# Altium footprint library 逸芬的库鸭.PcbLib: 255 footprints (part 11 of 20)
Each footprint in its own frame and in the unit in brackets; x right, y up, seen from the top. Pads: shape width x height; smd on the part's side, far side on the other; paste and mask are expansions set on the pad; w line width, h text height; cw(c..) or ccw(c..) is an arc to the next point about the centre after c.
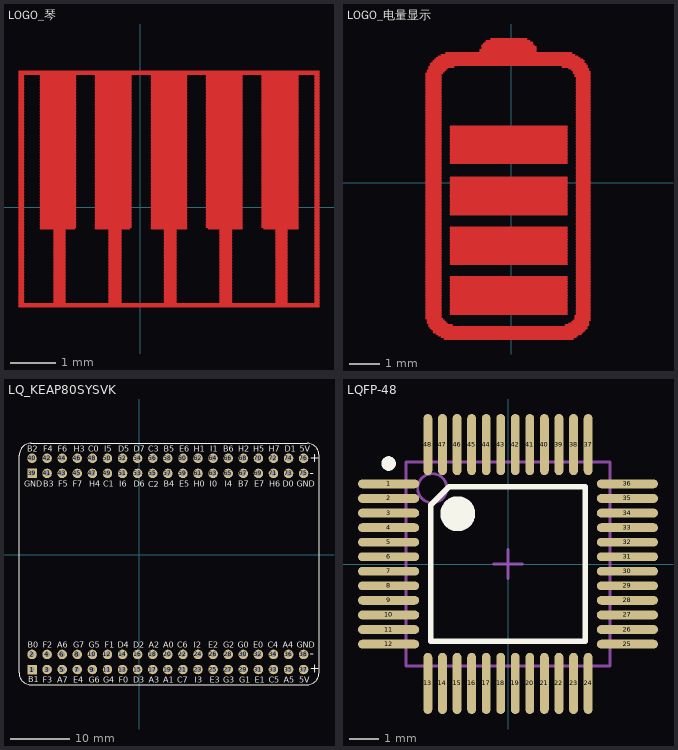
[diagram p10: the footprints below, top view; thin cyan lines are the x and y axes]

## LOGO_琴 [mm]
Top Layer:
  lines w0.033: -2.667,-2.187 3.937,-2.187 ; -2.667,-2.154 3.937,-2.154 ; -2.667,-2.121 3.937,-2.121 ; -2.667,-2.088 -2.568,-2.088 ; -2.667,-2.055 -2.568,-2.055 ; -2.667,-2.022 -2.568,-2.022 ; -2.667,-1.989 -2.568,-1.989 ; -2.667,-1.956 -2.568,-1.956 ; -2.667,-1.923 -2.568,-1.923 ; -2.667,-1.89 -2.568,-1.89 ; -2.667,-1.857 -2.568,-1.857 ; -2.667,-1.824 -2.568,-1.824 ; -2.667,-1.791 -2.568,-1.791 ; -2.667,-1.758 -2.568,-1.758 ; -2.667,-1.725 -2.568,-1.725 ; -2.667,-1.692 -2.568,-1.692 ; -2.667,-1.659 -2.568,-1.659 ; -2.667,-1.626 -2.568,-1.626 ; -2.667,-1.593 -2.568,-1.593 ; -2.667,-1.56 -2.568,-1.56 ; -2.667,-1.527 -2.568,-1.527 ; -2.667,-1.494 -2.568,-1.494 ; -2.667,-1.46 -2.568,-1.46 ; -2.667,-1.427 -2.568,-1.427 ; -2.667,-1.394 -2.568,-1.394 ; -2.667,-1.361 -2.568,-1.361 ; -2.667,-1.328 -2.568,-1.328 ; -2.667,-1.295 -2.568,-1.295 ; -2.667,-1.262 -2.568,-1.262 ; -2.667,-1.229 -2.568,-1.229 ; -2.667,-1.196 -2.568,-1.196 ; -2.667,-1.163 -2.568,-1.163 ; -2.667,-1.13 -2.568,-1.13 ; -2.667,-1.097 -2.568,-1.097 ; -2.667,-1.064 -2.568,-1.064 ; -2.667,-1.031 -2.568,-1.031 ; -2.667,-0.998 -2.568,-0.998 ; -2.667,-0.965 -2.568,-0.965 ; -2.667,-0.932 -2.568,-0.932 ; -2.667,-0.899 -2.568,-0.899 ; -2.667,-0.866 -2.568,-0.866 ; -2.667,-0.833 -2.568,-0.833 ; -2.667,-0.8 -2.568,-0.8 ; -2.667,-0.767 -2.568,-0.767 ; -2.667,-0.734 -2.568,-0.734 ; -2.667,-0.701 -2.568,-0.701 ; -2.667,-0.668 -2.568,-0.668 ; -2.667,-0.635 -2.568,-0.635 ; -2.667,-0.602 -2.568,-0.602 ; -2.667,-0.569 -2.568,-0.569 ; -2.667,-0.536 -2.568,-0.536 ; -2.667,-0.503 -2.568,-0.503 ; -2.667,-0.47 -2.568,-0.47 ; -2.667,-0.437 -2.568,-0.437 ; -2.667,-0.404 -2.568,-0.404 ; -2.667,-0.371 -2.568,-0.371 ; -2.667,-0.338 -2.568,-0.338 ; -2.667,-0.305 -2.568,-0.305 ; -2.667,-0.272 -2.568,-0.272 ; -2.667,-0.239 -2.568,-0.239 ; -2.667,-0.206 -2.568,-0.206 ; -2.667,-0.173 -2.568,-0.173 ; -2.667,-0.14 -2.568,-0.14 ; -2.667,-0.107 -2.568,-0.107 ; -2.667,-0.074 -2.568,-0.074 ; -2.667,-0.041 -2.568,-0.041 ; -2.667,-0.008 -2.568,-0.008 ; -2.667,0.025 -2.568,0.025 ; -2.667,0.058 -2.568,0.058 ; -2.667,0.091 -2.568,0.091 ; -2.667,0.124 -2.568,0.124 ; -2.667,0.157 -2.568,0.157 ; -2.667,0.191 -2.568,0.191 ; -2.667,0.224 -2.568,0.224 ; -2.667,0.257 -2.568,0.257 ; -2.667,0.29 -2.568,0.29 ; -2.667,0.323 -2.568,0.323 ; -2.667,0.356 -2.568,0.356 ; -2.667,0.389 -2.568,0.389 ; -2.667,0.422 -2.568,0.422 ; -2.667,0.455 -2.568,0.455 ; -2.667,0.488 -2.568,0.488 ; -2.667,0.521 -2.568,0.521 ; -2.667,0.554 -2.568,0.554 ; -2.667,0.587 -2.568,0.587 ; -2.667,0.62 -2.568,0.62 ; -2.667,0.653 -2.568,0.653 ; -2.667,0.686 -2.568,0.686 ; -2.667,0.719 -2.568,0.719 ; -2.667,0.752 -2.568,0.752 ; -2.667,0.785 -2.568,0.785 ; -2.667,0.818 -2.568,0.818 ; -2.667,0.851 -2.568,0.851 ; -2.667,0.884 -2.568,0.884 ; -2.667,0.917 -2.568,0.917 ; -2.667,0.95 -2.568,0.95 ; -2.667,0.983 -2.568,0.983 ; -2.667,1.016 -2.568,1.016 ; -2.667,1.049 -2.568,1.049 ; -2.667,1.082 -2.568,1.082 ; -2.667,1.115 -2.568,1.115 ; -2.667,1.148 -2.568,1.148 ; -2.667,1.181 -2.568,1.181 ; -2.667,1.214 -2.568,1.214 ; -2.667,1.247 -2.568,1.247 ; -2.667,1.28 -2.568,1.28 ; -2.667,1.313 -2.568,1.313 ; -2.667,1.346 -2.568,1.346 ; -2.667,1.379 -2.568,1.379 ; -2.667,1.412 -2.568,1.412 ; -2.667,1.445 -2.568,1.445 ; -2.667,1.478 -2.568,1.478 ; -2.667,1.511 -2.568,1.511 ; -2.667,1.544 -2.568,1.544 ; -2.667,1.577 -2.568,1.577 ; -2.667,1.61 -2.568,1.61 ; -2.667,1.643 -2.568,1.643 ; -2.667,1.676 -2.568,1.676 ; -2.667,1.709 -2.568,1.709 ; -2.667,1.742 -2.568,1.742 ; -2.667,1.775 -2.568,1.775 ; -2.667,1.808 -2.568,1.808 ; -2.667,1.841 -2.568,1.841 ; -2.667,1.875 -2.568,1.875 ; -2.667,1.908 -2.568,1.908 ; -2.667,1.941 -2.568,1.941 ; -2.667,1.974 -2.568,1.974 ; -2.667,2.007 -2.568,2.007 ; -2.667,2.04 -2.568,2.04 ; -2.667,2.073 -2.568,2.073 ; -2.667,2.106 -2.568,2.106 ; -2.667,2.139 -2.568,2.139 ; -2.667,2.172 -2.568,2.172 ; -2.667,2.205 -2.568,2.205 ; -2.667,2.238 -2.568,2.238 ; -2.667,2.271 -2.568,2.271 ; -2.667,2.304 -2.568,2.304 ; -2.667,2.337 -2.568,2.337 ; -2.667,2.37 -2.568,2.37 ; -2.667,2.403 -2.568,2.403 ; -2.667,2.436 -2.568,2.436 ; -2.667,2.469 -2.568,2.469 ; -2.667,2.502 -2.568,2.502 ; -2.667,2.535 -2.568,2.535 ; -2.667,2.568 -2.568,2.568 ; -2.667,2.601 -2.568,2.601 ; -2.667,2.634 -2.568,2.634 ; -2.667,2.667 -2.568,2.667 ; -2.667,2.7 -2.568,2.7 ; -2.667,2.733 -2.568,2.733 ; -2.667,2.766 -2.568,2.766 ; -2.667,2.799 -2.568,2.799 ; -2.667,2.832 -2.568,2.832 ; -2.667,2.865 -2.568,2.865 ; -2.667,2.898 -2.568,2.898 ; -2.667,2.931 3.937,2.931 ; -2.667,2.964 3.937,2.964 ; -2.667,2.997 3.937,2.997 ; -2.205,-0.47 -1.445,-0.47 ; -2.205,-0.437 -1.412,-0.437 ; -2.205,-0.404 -1.412,-0.404 ; -2.205,-0.371 -1.412,-0.371 ; -2.205,-0.338 -1.412,-0.338 ; -2.205,-0.305 -1.412,-0.305 ; -2.205,-0.272 -1.412,-0.272 ; -2.205,-0.239 -1.412,-0.239 ; -2.205,-0.206 -1.412,-0.206 ; -2.205,-0.173 -1.412,-0.173 ; -2.205,-0.14 -1.412,-0.14 ; -2.205,-0.107 -1.412,-0.107 ; -2.205,-0.074 -1.412,-0.074 ; -2.205,-0.041 -1.412,-0.041 ; -2.205,-0.008 -1.412,-0.008 ; -2.205,0.025 -1.412,0.025 ; -2.205,0.058 -1.412,0.058 ; -2.205,0.091 -1.412,0.091 ; -2.205,0.124 -1.412,0.124 ; -2.205,0.157 -1.412,0.157 ; -2.205,0.191 -1.412,0.191 ; -2.205,0.224 -1.412,0.224 ; -2.205,0.257 -1.412,0.257 ; -2.205,0.29 -1.412,0.29 ; -2.205,0.323 -1.412,0.323 ; -2.205,0.356 -1.412,0.356 ; -2.205,0.389 -1.412,0.389 ; -2.205,0.422 -1.412,0.422 ; -2.205,0.455 -1.412,0.455 ; -2.205,0.488 -1.412,0.488 ; -2.205,0.521 -1.412,0.521 ; -2.205,0.554 -1.412,0.554 ; -2.205,0.587 -1.412,0.587 ; -2.205,0.62 -1.412,0.62 ; -2.205,0.653 -1.412,0.653 ; -2.205,0.686 -1.412,0.686 ; -2.205,0.719 -1.412,0.719 ; -2.205,0.752 -1.412,0.752 ; -2.205,0.785 -1.412,0.785 ; -2.205,0.818 -1.412,0.818 ; -2.205,0.851 -1.412,0.851 ; -2.205,0.884 -1.412,0.884 ; -2.205,0.917 -1.412,0.917 ; -2.205,0.95 -1.412,0.95 ; -2.205,0.983 -1.412,0.983 ; -2.205,1.016 -1.412,1.016 ; -2.205,1.049 -1.412,1.049 ; -2.205,1.082 -1.412,1.082 ; -2.205,1.115 -1.412,1.115 ; -2.205,1.148 -1.412,1.148 ; -2.205,1.181 -1.412,1.181 ; -2.205,1.214 -1.412,1.214 ; -2.205,1.247 -1.412,1.247 ; -2.205,1.28 -1.412,1.28 ; -2.205,1.313 -1.412,1.313 ; -2.205,1.346 -1.412,1.346 ; -2.205,1.379 -1.412,1.379 ; -2.205,1.412 -1.412,1.412 ; -2.205,1.445 -1.412,1.445 ; -2.205,1.478 -1.412,1.478 ; -2.205,1.511 -1.412,1.511 ; -2.205,1.544 -1.412,1.544 ; -2.205,1.577 -1.412,1.577 ; -2.205,1.61 -1.412,1.61 ; -2.205,1.643 -1.412,1.643 ; -2.205,1.676 -1.412,1.676 ; -2.205,1.709 -1.412,1.709 ; -2.205,1.742 -1.412,1.742 ; -2.205,1.775 -1.412,1.775 ; -2.205,1.808 -1.412,1.808 ; -2.205,1.841 -1.412,1.841 ; -2.205,1.875 -1.412,1.875 ; -2.205,1.908 -1.412,1.908 ; -2.205,1.941 -1.412,1.941 ; -2.205,1.974 -1.412,1.974 ; -2.205,2.007 -1.412,2.007 ; -2.205,2.04 -1.412,2.04 ; -2.205,2.073 -1.412,2.073 ; -2.205,2.106 -1.412,2.106 ; -2.205,2.139 -1.412,2.139 ; -2.205,2.172 -1.412,2.172 ; -2.205,2.205 -1.412,2.205 ; -2.205,2.238 -1.412,2.238 ; -2.205,2.271 -1.412,2.271 ; -2.205,2.304 -1.412,2.304 ; -2.205,2.337 -1.412,2.337 ; -2.205,2.37 -1.412,2.37 ; -2.205,2.403 -1.412,2.403 ; -2.205,2.436 -1.412,2.436 ; -2.205,2.469 -1.412,2.469 ; -2.205,2.502 -1.412,2.502 ; -2.205,2.535 -1.412,2.535 ; -2.205,2.568 -1.412,2.568 ; -2.205,2.601 -1.412,2.601 ; -2.205,2.634 -1.412,2.634 ; -2.205,2.667 -1.412,2.667 ; -2.205,2.7 -1.412,2.7 ; -2.205,2.733 -1.412,2.733 ; -2.205,2.766 -1.412,2.766 ; -2.205,2.799 -1.412,2.799 ; -2.205,2.832 -1.412,2.832 ; -2.205,2.865 -1.412,2.865 ; -2.205,2.898 -1.412,2.898 ; -1.908,-2.088 -1.643,-2.088 ; -1.908,-2.055 -1.643,-2.055 ; -1.908,-2.022 -1.643,-2.022 ; -1.908,-1.989 -1.643,-1.989 ; -1.908,-1.956 -1.643,-1.956 ; -1.908,-1.923 -1.643,-1.923 ; -1.908,-1.89 -1.643,-1.89 ; -1.908,-1.857 -1.643,-1.857 ; -1.908,-1.824 -1.643,-1.824 ; -1.908,-1.791 -1.643,-1.791 ; -1.908,-1.758 -1.643,-1.758 ; -1.908,-1.725 -1.643,-1.725 ; -1.908,-1.692 -1.643,-1.692 ; -1.908,-1.659 -1.643,-1.659 ; -1.908,-1.626 -1.643,-1.626 ; -1.908,-1.593 -1.643,-1.593 ; -1.908,-1.56 -1.643,-1.56 ; -1.908,-1.527 -1.643,-1.527 ; -1.908,-1.494 -1.643,-1.494 ; -1.908,-1.46 -1.643,-1.46 ; -1.908,-1.427 -1.643,-1.427 ; -1.908,-1.394 -1.643,-1.394 ; -1.908,-1.361 -1.643,-1.361 ; -1.908,-1.328 -1.643,-1.328 ; -1.908,-1.295 -1.643,-1.295 ; -1.908,-1.262 -1.643,-1.262 ; -1.908,-1.229 -1.643,-1.229 ; -1.908,-1.196 -1.643,-1.196 ; -1.908,-1.163 -1.643,-1.163 ; -1.908,-1.13 -1.643,-1.13 ; -1.908,-1.097 -1.643,-1.097 ; -1.908,-1.064 -1.643,-1.064 ; -1.908,-1.031 -1.643,-1.031 ; -1.908,-0.998 -1.643,-0.998 ; -1.908,-0.965 -1.643,-0.965 ; -1.908,-0.932 -1.643,-0.932 ; -1.908,-0.899 -1.643,-0.899 ; -1.908,-0.866 -1.643,-0.866 ; -1.908,-0.833 -1.643,-0.833 ; -1.908,-0.8 -1.643,-0.8 ; -1.908,-0.767 -1.643,-0.767 ; -1.908,-0.734 -1.643,-0.734 ; -1.908,-0.701 -1.643,-0.701 ; -1.908,-0.668 -1.643,-0.668 ; -1.908,-0.635 -1.643,-0.635 ; -1.908,-0.602 -1.643,-0.602 ; -1.908,-0.569 -1.643,-0.569 ; -1.908,-0.536 -1.643,-0.536 ; -1.908,-0.503 -1.643,-0.503 ; -0.983,-0.47 -0.224,-0.47 ; -0.983,-0.437 -0.191,-0.437 ; -0.983,-0.404 -0.191,-0.404 ; -0.983,-0.371 -0.191,-0.371 ; -0.983,-0.338 -0.191,-0.338 ; -0.983,-0.305 -0.191,-0.305 ; -0.983,-0.272 -0.191,-0.272 ; -0.983,-0.239 -0.191,-0.239 ; -0.983,-0.206 -0.191,-0.206 ; -0.983,-0.173 -0.191,-0.173 ; -0.983,-0.14 -0.191,-0.14 ; -0.983,-0.107 -0.191,-0.107 ; -0.983,-0.074 -0.191,-0.074 ; -0.983,-0.041 -0.191,-0.041 ; -0.983,-0.008 -0.191,-0.008 ; -0.983,0.025 -0.191,0.025 ; -0.983,0.058 -0.191,0.058 ; -0.983,0.091 -0.191,0.091 ; -0.983,0.124 -0.191,0.124 ; -0.983,0.157 -0.191,0.157 ; -0.983,0.191 -0.191,0.191 ; -0.983,0.224 -0.191,0.224 ; -0.983,0.257 -0.191,0.257 ; -0.983,0.29 -0.191,0.29 ; -0.983,0.323 -0.191,0.323 ; -0.983,0.356 -0.191,0.356 ; -0.983,0.389 -0.191,0.389 ; -0.983,0.422 -0.191,0.422 ; -0.983,0.455 -0.191,0.455 ; -0.983,0.488 -0.191,0.488 ; -0.983,0.521 -0.191,0.521 ; -0.983,0.554 -0.191,0.554 ; -0.983,0.587 -0.191,0.587 ; -0.983,0.62 -0.191,0.62 ; -0.983,0.653 -0.191,0.653 ; -0.983,0.686 -0.191,0.686 ; -0.983,0.719 -0.191,0.719 ; -0.983,0.752 -0.191,0.752 ; -0.983,0.785 -0.191,0.785 ; -0.983,0.818 -0.191,0.818 ; -0.983,0.851 -0.191,0.851 ; -0.983,0.884 -0.191,0.884 ; -0.983,0.917 -0.191,0.917 ; -0.983,0.95 -0.191,0.95 ; -0.983,0.983 -0.191,0.983 ; -0.983,1.016 -0.191,1.016 ; -0.983,1.049 -0.191,1.049 ; -0.983,1.082 -0.191,1.082 ; -0.983,1.115 -0.191,1.115 ; -0.983,1.148 -0.191,1.148 ; -0.983,1.181 -0.191,1.181 ; -0.983,1.214 -0.191,1.214 ; -0.983,1.247 -0.191,1.247 ; -0.983,1.28 -0.191,1.28 ; -0.983,1.313 -0.191,1.313 ; -0.983,1.346 -0.191,1.346 ; -0.983,1.379 -0.191,1.379 ; -0.983,1.412 -0.191,1.412 ; -0.983,1.445 -0.191,1.445 ; -0.983,1.478 -0.191,1.478 ; -0.983,1.511 -0.191,1.511 ; -0.983,1.544 -0.191,1.544 ; -0.983,1.577 -0.191,1.577 ; -0.983,1.61 -0.191,1.61 ; -0.983,1.643 -0.191,1.643 ; -0.983,1.676 -0.191,1.676 ; -0.983,1.709 -0.191,1.709 ; -0.983,1.742 -0.191,1.742 ; -0.983,1.775 -0.191,1.775 ; -0.983,1.808 -0.191,1.808 ; -0.983,1.841 -0.191,1.841 ; -0.983,1.875 -0.191,1.875 ; -0.983,1.908 -0.191,1.908 ; -0.983,1.941 -0.191,1.941 ; -0.983,1.974 -0.191,1.974 ; -0.983,2.007 -0.191,2.007 ; -0.983,2.04 -0.191,2.04 ; -0.983,2.073 -0.191,2.073 ; -0.983,2.106 -0.191,2.106 ; -0.983,2.139 -0.191,2.139 ; -0.983,2.172 -0.191,2.172 ; -0.983,2.205 -0.191,2.205 ; -0.983,2.238 -0.191,2.238 ; -0.983,2.271 -0.191,2.271 ; -0.983,2.304 -0.191,2.304 ; -0.983,2.337 -0.191,2.337 ; -0.983,2.37 -0.191,2.37 ; -0.983,2.403 -0.191,2.403 ; -0.983,2.436 -0.191,2.436 ; -0.983,2.469 -0.191,2.469 ; -0.983,2.502 -0.191,2.502 ; -0.983,2.535 -0.191,2.535 ; -0.983,2.568 -0.191,2.568 ; -0.983,2.601 -0.191,2.601 ; -0.983,2.634 -0.191,2.634 ; -0.983,2.667 -0.191,2.667 ; -0.983,2.7 -0.191,2.7 ; -0.983,2.733 -0.191,2.733 ; -0.983,2.766 -0.191,2.766 ; -0.983,2.799 -0.191,2.799 ; -0.983,2.832 -0.191,2.832 ; -0.983,2.865 -0.191,2.865 ; -0.983,2.898 -0.191,2.898 ; -0.686,-2.088 -0.422,-2.088 ; -0.686,-2.055 -0.422,-2.055 ; -0.686,-2.022 -0.422,-2.022 ; -0.686,-1.989 -0.422,-1.989 ; -0.686,-1.956 -0.422,-1.956 ; -0.686,-1.923 -0.422,-1.923 ; -0.686,-1.89 -0.422,-1.89 ; -0.686,-1.857 -0.422,-1.857 ; -0.686,-1.824 -0.422,-1.824 ; -0.686,-1.791 -0.422,-1.791 ; -0.686,-1.758 -0.422,-1.758 ; -0.686,-1.725 -0.422,-1.725 ; -0.686,-1.692 -0.422,-1.692 ; -0.686,-1.659 -0.422,-1.659 ; -0.686,-1.626 -0.422,-1.626 ; -0.686,-1.593 -0.422,-1.593 ; -0.686,-1.56 -0.422,-1.56 ; -0.686,-1.527 -0.422,-1.527 ; -0.686,-1.494 -0.422,-1.494 ; -0.686,-1.46 -0.422,-1.46 ; -0.686,-1.427 -0.422,-1.427 ; -0.686,-1.394 -0.422,-1.394 ; -0.686,-1.361 -0.422,-1.361 ; -0.686,-1.328 -0.422,-1.328 ; -0.686,-1.295 -0.422,-1.295 ; -0.686,-1.262 -0.422,-1.262 ; -0.686,-1.229 -0.422,-1.229 ; -0.686,-1.196 -0.422,-1.196 ; -0.686,-1.163 -0.422,-1.163 ; -0.686,-1.13 -0.422,-1.13 ; -0.686,-1.097 -0.422,-1.097 ; -0.686,-1.064 -0.422,-1.064 ; -0.686,-1.031 -0.422,-1.031 ; -0.686,-0.998 -0.422,-0.998 ; -0.686,-0.965 -0.422,-0.965 ; -0.686,-0.932 -0.422,-0.932 ; -0.686,-0.899 -0.422,-0.899 ; -0.686,-0.866 -0.422,-0.866 ; -0.686,-0.833 -0.422,-0.833 ; -0.686,-0.8 -0.422,-0.8 ; -0.686,-0.767 -0.422,-0.767 ; -0.686,-0.734 -0.422,-0.734 ; -0.686,-0.701 -0.422,-0.701 ; -0.686,-0.668 -0.422,-0.668 ; -0.686,-0.635 -0.422,-0.635 ; -0.686,-0.602 -0.422,-0.602 ; -0.686,-0.569 -0.422,-0.569 ; -0.686,-0.536 -0.422,-0.536 ; -0.686,-0.503 -0.422,-0.503 ; 0.239,-0.47 1.031,-0.47 ; 0.239,-0.437 1.031,-0.437 ; 0.239,-0.404 1.031,-0.404 ; 0.239,-0.371 1.031,-0.371 ; 0.239,-0.338 1.031,-0.338 ; 0.239,-0.305 1.031,-0.305 ; 0.239,-0.272 1.031,-0.272 ; 0.239,-0.239 1.031,-0.239 ; 0.239,-0.206 1.031,-0.206 ; 0.239,-0.173 1.031,-0.173 ; 0.239,-0.14 1.031,-0.14 ; 0.239,-0.107 1.031,-0.107 ; 0.239,-0.074 1.031,-0.074 ; 0.239,-0.041 1.031,-0.041 ; 0.239,-0.008 1.031,-0.008 ; 0.239,0.025 1.031,0.025 ; 0.239,0.058 1.031,0.058 ; 0.239,0.091 1.031,0.091 ; 0.239,0.124 1.031,0.124 ; 0.239,0.157 1.031,0.157 ; 0.239,0.191 1.031,0.191 ; 0.239,0.224 1.031,0.224 ; 0.239,0.257 1.031,0.257 ; 0.239,0.29 1.031,0.29 ; 0.239,0.323 1.031,0.323 ; 0.239,0.356 1.031,0.356 ; 0.239,0.389 1.031,0.389 ; 0.239,0.422 1.031,0.422 ; 0.239,0.455 1.031,0.455 ; 0.239,0.488 1.031,0.488 ; 0.239,0.521 1.031,0.521 ; 0.239,0.554 1.031,0.554 ; 0.239,0.587 1.031,0.587 ; 0.239,0.62 1.031,0.62 ; 0.239,0.653 1.031,0.653 ; 0.239,0.686 1.031,0.686 ; 0.239,0.719 1.031,0.719 ; 0.239,0.752 1.031,0.752 ; 0.239,0.785 1.031,0.785 ; 0.239,0.818 1.031,0.818 ; 0.239,0.851 1.031,0.851 ; 0.239,0.884 1.031,0.884 ; 0.239,0.917 1.031,0.917 ; 0.239,0.95 1.031,0.95 ; 0.239,0.983 1.031,0.983 ; 0.239,1.016 1.031,1.016 ; 0.239,1.049 1.031,1.049 ; 0.239,1.082 1.031,1.082 ; 0.239,1.115 1.031,1.115 ; 0.239,1.148 1.031,1.148 ; 0.239,1.181 1.031,1.181 ; 0.239,1.214 1.031,1.214 ; 0.239,1.247 1.031,1.247 ; 0.239,1.28 1.031,1.28 ; 0.239,1.313 1.031,1.313 ; 0.239,1.346 1.031,1.346 ; 0.239,1.379 1.031,1.379 ; 0.239,1.412 1.031,1.412 ; 0.239,1.445 1.031,1.445 ; 0.239,1.478 1.031,1.478 ; 0.239,1.511 1.031,1.511 ; 0.239,1.544 1.031,1.544 ; 0.239,1.577 1.031,1.577 ; 0.239,1.61 1.031,1.61 ; 0.239,1.643 1.031,1.643 ; 0.239,1.676 1.031,1.676 ; 0.239,1.709 1.031,1.709 ; 0.239,1.742 1.031,1.742 ; 0.239,1.775 1.031,1.775 ; 0.239,1.808 1.031,1.808 ; 0.239,1.841 1.031,1.841 ; 0.239,1.875 1.031,1.875 ; 0.239,1.908 1.031,1.908 ; 0.239,1.941 1.031,1.941 ; 0.239,1.974 1.031,1.974 ; 0.239,2.007 1.031,2.007 ; 0.239,2.04 1.031,2.04 ; 0.239,2.073 1.031,2.073 ; 0.239,2.106 1.031,2.106 ; 0.239,2.139 1.031,2.139 ; 0.239,2.172 1.031,2.172 ; 0.239,2.205 1.031,2.205 ; 0.239,2.238 1.031,2.238 ; 0.239,2.271 1.031,2.271 ; 0.239,2.304 1.031,2.304 ; 0.239,2.337 1.031,2.337 ; 0.239,2.37 1.031,2.37 ; 0.239,2.403 1.031,2.403 ; 0.239,2.436 1.031,2.436 ; 0.239,2.469 1.031,2.469 ; 0.239,2.502 1.031,2.502 ; 0.239,2.535 1.031,2.535 ; 0.239,2.568 1.031,2.568 ; 0.239,2.601 1.031,2.601 ; 0.239,2.634 1.031,2.634 ; 0.239,2.667 1.031,2.667 ; 0.239,2.7 1.031,2.7 ; 0.239,2.733 1.031,2.733 ; 0.239,2.766 1.031,2.766 ; 0.239,2.799 1.031,2.799 ; 0.239,2.832 1.031,2.832 ; 0.239,2.865 1.031,2.865 ; 0.239,2.898 1.031,2.898 ; 0.536,-2.088 0.8,-2.088 ; 0.536,-2.055 0.8,-2.055 ; 0.536,-2.022 0.8,-2.022 ; 0.536,-1.989 0.8,-1.989 ; 0.536,-1.956 0.8,-1.956 ; 0.536,-1.923 0.8,-1.923 ; 0.536,-1.89 0.8,-1.89 ; 0.536,-1.857 0.8,-1.857 ; 0.536,-1.824 0.8,-1.824 ; 0.536,-1.791 0.8,-1.791 ; 0.536,-1.758 0.8,-1.758 ; 0.536,-1.725 0.8,-1.725 ; 0.536,-1.692 0.8,-1.692 ; 0.536,-1.659 0.8,-1.659 ; 0.536,-1.626 0.8,-1.626 ; 0.536,-1.593 0.8,-1.593 ; 0.536,-1.56 0.8,-1.56 ; 0.536,-1.527 0.8,-1.527 ; 0.536,-1.494 0.8,-1.494 ; 0.536,-1.46 0.8,-1.46 ; 0.536,-1.427 0.8,-1.427 ; 0.536,-1.394 0.8,-1.394 ; 0.536,-1.361 0.8,-1.361 ; 0.536,-1.328 0.8,-1.328 ; 0.536,-1.295 0.8,-1.295 ; 0.536,-1.262 0.8,-1.262 ; 0.536,-1.229 0.8,-1.229 ; 0.536,-1.196 0.8,-1.196 ; 0.536,-1.163 0.8,-1.163 ; 0.536,-1.13 0.8,-1.13 ; 0.536,-1.097 0.8,-1.097 ; 0.536,-1.064 0.8,-1.064 ; 0.536,-1.031 0.8,-1.031 ; 0.536,-0.998 0.8,-0.998 ; 0.536,-0.965 0.8,-0.965 ; 0.536,-0.932 0.8,-0.932 ; 0.536,-0.899 0.8,-0.899 ; 0.536,-0.866 0.8,-0.866 ; 0.536,-0.833 0.8,-0.833 ; 0.536,-0.8 0.8,-0.8 ; 0.536,-0.767 0.8,-0.767 ; 0.536,-0.734 0.8,-0.734 ; 0.536,-0.701 0.8,-0.701 ; 0.536,-0.668 0.8,-0.668 ; 0.536,-0.635 0.8,-0.635 ; 0.536,-0.602 0.8,-0.602 ; 0.536,-0.569 0.8,-0.569 ; 0.536,-0.536 0.8,-0.536 ; 0.536,-0.503 0.8,-0.503 ; 1.46,-0.437 2.253,-0.437 ; 1.46,-0.404 2.253,-0.404 ; 1.46,-0.371 2.253,-0.371 ; 1.46,-0.338 2.253,-0.338 ; 1.46,-0.305 2.253,-0.305 ; 1.46,-0.272 2.253,-0.272 ; 1.46,-0.239 2.253,-0.239 ; 1.46,-0.206 2.253,-0.206 ; 1.46,-0.173 2.253,-0.173 ; 1.46,-0.14 2.253,-0.14 ; 1.46,-0.107 2.253,-0.107 ; 1.46,-0.074 2.253,-0.074 ; 1.46,-0.041 2.253,-0.041 ; 1.46,-0.008 2.253,-0.008 ; 1.46,0.025 2.253,0.025 ; 1.46,0.058 2.253,0.058 ; 1.46,0.091 2.253,0.091 ; 1.46,0.124 2.253,0.124 ; 1.46,0.157 2.253,0.157 ; 1.46,0.191 2.253,0.191 ; 1.46,0.224 2.253,0.224 ; 1.46,0.257 2.253,0.257 ; 1.46,0.29 2.253,0.29 ; 1.46,0.323 2.253,0.323 ; 1.46,0.356 2.253,0.356 ; 1.46,0.389 2.253,0.389 ; 1.46,0.422 2.253,0.422 ; 1.46,0.455 2.253,0.455 ; 1.46,0.488 2.253,0.488 ; 1.46,0.521 2.253,0.521 ; 1.46,0.554 2.253,0.554 ; 1.46,0.587 2.253,0.587 ; 1.46,0.62 2.253,0.62 ; 1.46,0.653 2.253,0.653 ; 1.46,0.686 2.253,0.686 ; 1.46,0.719 2.253,0.719 ; 1.46,0.752 2.253,0.752 ; 1.46,0.785 2.253,0.785 ; 1.46,0.818 2.253,0.818 ; 1.46,0.851 2.253,0.851 ; 1.46,0.884 2.253,0.884 ; 1.46,0.917 2.253,0.917 ; 1.46,0.95 2.253,0.95 ; 1.46,0.983 2.253,0.983 ; 1.46,1.016 2.253,1.016 ; 1.46,1.049 2.253,1.049 ; 1.46,1.082 2.253,1.082 ; 1.46,1.115 2.253,1.115 ; 1.46,1.148 2.253,1.148 ; 1.46,1.181 2.253,1.181 ; 1.46,1.214 2.253,1.214 ; 1.46,1.247 2.253,1.247 ; 1.46,1.28 2.253,1.28 ; 1.46,1.313 2.253,1.313 ; 1.46,1.346 2.253,1.346 ; 1.46,1.379 2.253,1.379 ; 1.46,1.412 2.253,1.412 ; 1.46,1.445 2.253,1.445 ; 1.46,1.478 2.253,1.478 ; 1.46,1.511 2.253,1.511 ; 1.46,1.544 2.253,1.544 ; 1.46,1.577 2.253,1.577 ; 1.46,1.61 2.253,1.61 ; 1.46,1.643 2.253,1.643 ; 1.46,1.676 2.253,1.676 ; 1.46,1.709 2.253,1.709 ; 1.46,1.742 2.253,1.742 ; 1.46,1.775 2.253,1.775 ; 1.46,1.808 2.253,1.808 ; 1.46,1.841 2.253,1.841 ; 1.46,1.875 2.253,1.875 ; 1.46,1.908 2.253,1.908 ; 1.46,1.941 2.253,1.941 ; 1.46,1.974 2.253,1.974 ; 1.46,2.007 2.253,2.007 ; 1.46,2.04 2.253,2.04 ; 1.46,2.073 2.253,2.073 ; 1.46,2.106 2.253,2.106 ; 1.46,2.139 2.253,2.139 ; 1.46,2.172 2.253,2.172 ; 1.46,2.205 2.253,2.205 ; 1.46,2.238 2.253,2.238 ; 1.46,2.271 2.253,2.271 ; 1.46,2.304 2.253,2.304 ; 1.46,2.337 2.253,2.337 ; 1.46,2.37 2.253,2.37 ; 1.46,2.403 2.253,2.403 ; 1.46,2.436 2.253,2.436 ; 1.46,2.469 2.253,2.469 ; 1.46,2.502 2.253,2.502 ; 1.46,2.535 2.253,2.535 ; 1.46,2.568 2.253,2.568 ; 1.46,2.601 2.253,2.601 ; 1.46,2.634 2.253,2.634 ; 1.46,2.667 2.253,2.667 ; 1.46,2.7 2.253,2.7 ; 1.46,2.733 2.253,2.733 ; 1.46,2.766 2.253,2.766 ; 1.46,2.799 2.253,2.799 ; 1.46,2.832 2.253,2.832 ; 1.46,2.865 2.253,2.865 ; 1.46,2.898 2.253,2.898 ; 1.494,-0.47 2.253,-0.47 ; 1.758,-2.088 2.022,-2.088 ; 1.758,-2.055 2.022,-2.055 ; 1.758,-2.022 2.022,-2.022 ; 1.758,-1.989 2.022,-1.989 ; 1.758,-1.956 2.022,-1.956 ; 1.758,-1.923 2.022,-1.923 ; 1.758,-1.89 2.022,-1.89 ; 1.758,-1.857 2.022,-1.857 ; 1.758,-1.824 2.022,-1.824 ; 1.758,-1.791 2.022,-1.791 ; 1.758,-1.758 2.022,-1.758 ; 1.758,-1.725 2.022,-1.725 ; 1.758,-1.692 2.022,-1.692 ; 1.758,-1.659 2.022,-1.659 ; 1.758,-1.626 2.022,-1.626 ; 1.758,-1.593 2.022,-1.593 ; 1.758,-1.56 2.022,-1.56 ; 1.758,-1.527 2.022,-1.527 ; 1.758,-1.494 2.022,-1.494 ; 1.758,-1.46 2.022,-1.46 ; 1.758,-1.427 2.022,-1.427 ; 1.758,-1.394 2.022,-1.394 ; 1.758,-1.361 2.022,-1.361 ; 1.758,-1.328 2.022,-1.328 ; 1.758,-1.295 2.022,-1.295 ; 1.758,-1.262 2.022,-1.262 ; 1.758,-1.229 2.022,-1.229 ; 1.758,-1.196 2.022,-1.196 ; 1.758,-1.163 2.022,-1.163 ; 1.758,-1.13 2.022,-1.13 ; 1.758,-1.097 2.022,-1.097 ; 1.758,-1.064 2.022,-1.064 ; 1.758,-1.031 2.022,-1.031 ; 1.758,-0.998 2.022,-0.998 ; 1.758,-0.965 2.022,-0.965 ; 1.758,-0.932 2.022,-0.932 ; 1.758,-0.899 2.022,-0.899 ; 1.758,-0.866 2.022,-0.866 ; 1.758,-0.833 2.022,-0.833 ; 1.758,-0.8 2.022,-0.8 ; 1.758,-0.767 2.022,-0.767 ; 1.758,-0.734 2.022,-0.734 ; 1.758,-0.701 2.022,-0.701 ; 1.758,-0.668 2.022,-0.668 ; 1.758,-0.635 2.022,-0.635 ; 1.758,-0.602 2.022,-0.602 ; 1.758,-0.569 2.022,-0.569 ; 1.758,-0.536 2.022,-0.536 ; 1.758,-0.503 2.022,-0.503 ; 2.682,-0.437 3.475,-0.437 ; 2.682,-0.404 3.475,-0.404 ; 2.682,-0.371 3.475,-0.371 ; 2.682,-0.338 3.475,-0.338 ; 2.682,-0.305 3.475,-0.305 ; 2.682,-0.272 3.475,-0.272 ; 2.682,-0.239 3.475,-0.239 ; 2.682,-0.206 3.475,-0.206 ; 2.682,-0.173 3.475,-0.173 ; 2.682,-0.14 3.475,-0.14 ; 2.682,-0.107 3.475,-0.107 ; 2.682,-0.074 3.475,-0.074 ; 2.682,-0.041 3.475,-0.041 ; 2.682,-0.008 3.475,-0.008 ; 2.682,0.025 3.475,0.025 ; 2.682,0.058 3.475,0.058 ; 2.682,0.091 3.475,0.091 ; 2.682,0.124 3.475,0.124 ; 2.682,0.157 3.475,0.157 ; 2.682,0.191 3.475,0.191 ; 2.682,0.224 3.475,0.224 ; 2.682,0.257 3.475,0.257 ; 2.682,0.29 3.475,0.29 ; 2.682,0.323 3.475,0.323 ; 2.682,0.356 3.475,0.356 ; 2.682,0.389 3.475,0.389 ; 2.682,0.422 3.475,0.422 ; 2.682,0.455 3.475,0.455 ; 2.682,0.488 3.475,0.488 ; 2.682,0.521 3.475,0.521 ; 2.682,0.554 3.475,0.554 ; 2.682,0.587 3.475,0.587 ; 2.682,0.62 3.475,0.62 ; 2.682,0.653 3.475,0.653 ; 2.682,0.686 3.475,0.686 ; 2.682,0.719 3.475,0.719 ; 2.682,0.752 3.475,0.752 ; 2.682,0.785 3.475,0.785 ; 2.682,0.818 3.475,0.818 ; 2.682,0.851 3.475,0.851 ; 2.682,0.884 3.475,0.884 ; 2.682,0.917 3.475,0.917 ; 2.682,0.95 3.475,0.95 ; 2.682,0.983 3.475,0.983 ; 2.682,1.016 3.475,1.016 ; 2.682,1.049 3.475,1.049 ; 2.682,1.082 3.475,1.082 ; 2.682,1.115 3.475,1.115 ; 2.682,1.148 3.475,1.148 ; 2.682,1.181 3.475,1.181 ; 2.682,1.214 3.475,1.214 ; 2.682,1.247 3.475,1.247 ; 2.682,1.28 3.475,1.28 ; 2.682,1.313 3.475,1.313 ; 2.682,1.346 3.475,1.346 ; 2.682,1.379 3.475,1.379 ; 2.682,1.412 3.475,1.412 ; 2.682,1.445 3.475,1.445 ; 2.682,1.478 3.475,1.478 ; 2.682,1.511 3.475,1.511 ; 2.682,1.544 3.475,1.544 ; 2.682,1.577 3.475,1.577 ; 2.682,1.61 3.475,1.61 ; 2.682,1.643 3.475,1.643 ; 2.682,1.676 3.475,1.676 ; 2.682,1.709 3.475,1.709 ; 2.682,1.742 3.475,1.742 ; 2.682,1.775 3.475,1.775 ; 2.682,1.808 3.475,1.808 ; 2.682,1.841 3.475,1.841 ; 2.682,1.875 3.475,1.875 ; 2.682,1.908 3.475,1.908 ; 2.682,1.941 3.475,1.941 ; 2.682,1.974 3.475,1.974 ; 2.682,2.007 3.475,2.007 ; 2.682,2.04 3.475,2.04 ; 2.682,2.073 3.475,2.073 ; 2.682,2.106 3.475,2.106 ; 2.682,2.139 3.475,2.139 ; 2.682,2.172 3.475,2.172 ; 2.682,2.205 3.475,2.205 ; 2.682,2.238 3.475,2.238 ; 2.682,2.271 3.475,2.271 ; 2.682,2.304 3.475,2.304 ; 2.682,2.337 3.475,2.337 ; 2.682,2.37 3.475,2.37 ; 2.682,2.403 3.475,2.403 ; 2.682,2.436 3.475,2.436 ; 2.682,2.469 3.475,2.469 ; 2.682,2.502 3.475,2.502 ; 2.682,2.535 3.475,2.535 ; 2.682,2.568 3.475,2.568 ; 2.682,2.601 3.475,2.601 ; 2.682,2.634 3.475,2.634 ; 2.682,2.667 3.475,2.667 ; 2.682,2.7 3.475,2.7 ; 2.682,2.733 3.475,2.733 ; 2.682,2.766 3.475,2.766 ; 2.682,2.799 3.475,2.799 ; 2.682,2.832 3.475,2.832 ; 2.682,2.865 3.475,2.865 ; 2.682,2.898 3.475,2.898 ; 2.715,-0.47 3.475,-0.47 ; 2.979,-2.088 3.244,-2.088 ; 2.979,-2.055 3.244,-2.055 ; 2.979,-2.022 3.244,-2.022 ; 2.979,-1.989 3.244,-1.989 ; 2.979,-1.956 3.244,-1.956 ; 2.979,-1.923 3.244,-1.923 ; 2.979,-1.89 3.244,-1.89 ; 2.979,-1.857 3.244,-1.857 ; 2.979,-1.824 3.244,-1.824 ; 2.979,-1.791 3.244,-1.791 ; 2.979,-1.758 3.244,-1.758 ; 2.979,-1.725 3.244,-1.725 ; 2.979,-1.692 3.244,-1.692 ; 2.979,-1.659 3.244,-1.659 ; 2.979,-1.626 3.244,-1.626 ; 2.979,-1.593 3.244,-1.593 ; 2.979,-1.56 3.244,-1.56 ; 2.979,-1.527 3.244,-1.527 ; 2.979,-1.494 3.244,-1.494 ; 2.979,-1.46 3.244,-1.46 ; 2.979,-1.427 3.244,-1.427 ; 2.979,-1.394 3.244,-1.394 ; 2.979,-1.361 3.244,-1.361 ; 2.979,-1.328 3.244,-1.328 ; 2.979,-1.295 3.244,-1.295 ; 2.979,-1.262 3.244,-1.262 ; 2.979,-1.229 3.244,-1.229 ; 2.979,-1.196 3.244,-1.196 ; 2.979,-1.163 3.244,-1.163 ; 2.979,-1.13 3.244,-1.13 ; 2.979,-1.097 3.244,-1.097 ; 2.979,-1.064 3.244,-1.064 ; 2.979,-1.031 3.244,-1.031 ; 2.979,-0.998 3.244,-0.998 ; 2.979,-0.965 3.244,-0.965 ; 2.979,-0.932 3.244,-0.932 ; 2.979,-0.899 3.244,-0.899 ; 2.979,-0.866 3.244,-0.866 ; 2.979,-0.833 3.244,-0.833 ; 2.979,-0.8 3.244,-0.8 ; 2.979,-0.767 3.244,-0.767 ; 2.979,-0.734 3.244,-0.734 ; 2.979,-0.701 3.244,-0.701 ; 2.979,-0.668 3.244,-0.668 ; 2.979,-0.635 3.244,-0.635 ; 2.979,-0.602 3.244,-0.602 ; 2.979,-0.569 3.244,-0.569 ; 2.979,-0.536 3.244,-0.536 ; 2.979,-0.503 3.244,-0.503 ; 3.838,-2.088 3.937,-2.088 ; 3.838,-2.055 3.937,-2.055 ; 3.838,-2.022 3.937,-2.022 ; 3.838,-1.989 3.937,-1.989 ; 3.838,-1.956 3.937,-1.956 ; 3.838,-1.923 3.937,-1.923 ; 3.838,-1.89 3.937,-1.89 ; 3.838,-1.857 3.937,-1.857 ; 3.838,-1.824 3.937,-1.824 ; 3.838,-1.791 3.937,-1.791 ; 3.838,-1.758 3.937,-1.758 ; 3.838,-1.725 3.937,-1.725 ; 3.838,-1.692 3.937,-1.692 ; 3.838,-1.659 3.937,-1.659 ; 3.838,-1.626 3.937,-1.626 ; 3.838,-1.593 3.937,-1.593 ; 3.838,-1.56 3.937,-1.56 ; 3.838,-1.527 3.937,-1.527 ; 3.838,-1.494 3.937,-1.494 ; 3.838,-1.46 3.937,-1.46 ; 3.838,-1.427 3.937,-1.427 ; 3.838,-1.394 3.937,-1.394 ; 3.838,-1.361 3.937,-1.361 ; 3.838,-1.328 3.937,-1.328 ; 3.838,-1.295 3.937,-1.295 ; 3.838,-1.262 3.937,-1.262 ; 3.838,-1.229 3.937,-1.229 ; 3.838,-1.196 3.937,-1.196 ; 3.838,-1.163 3.937,-1.163 ; 3.838,-1.13 3.937,-1.13 ; 3.838,-1.097 3.937,-1.097 ; 3.838,-1.064 3.937,-1.064 ; 3.838,-1.031 3.937,-1.031 ; 3.838,-0.998 3.937,-0.998 ; 3.838,-0.965 3.937,-0.965 ; 3.838,-0.932 3.937,-0.932 ; 3.838,-0.899 3.937,-0.899 ; 3.838,-0.866 3.937,-0.866 ; 3.838,-0.833 3.937,-0.833 ; 3.838,-0.8 3.937,-0.8 ; 3.838,-0.767 3.937,-0.767 ; 3.838,-0.734 3.937,-0.734 ; 3.838,-0.701 3.937,-0.701 ; 3.838,-0.668 3.937,-0.668 ; 3.838,-0.635 3.937,-0.635 ; 3.838,-0.602 3.937,-0.602 ; 3.838,-0.569 3.937,-0.569 ; 3.838,-0.536 3.937,-0.536 ; 3.838,-0.503 3.937,-0.503 ; 3.838,-0.47 3.937,-0.47 ; 3.838,-0.437 3.937,-0.437 ; 3.838,-0.404 3.937,-0.404 ; 3.838,-0.371 3.937,-0.371 ; 3.838,-0.338 3.937,-0.338 ; 3.838,-0.305 3.937,-0.305 ; 3.838,-0.272 3.937,-0.272 ; 3.838,-0.239 3.937,-0.239 ; 3.838,-0.206 3.937,-0.206 ; 3.838,-0.173 3.937,-0.173 ; 3.838,-0.14 3.937,-0.14 ; 3.838,-0.107 3.937,-0.107 ; 3.838,-0.074 3.937,-0.074 ; 3.838,-0.041 3.937,-0.041 ; 3.838,-0.008 3.937,-0.008 ; 3.838,0.025 3.937,0.025 ; 3.838,0.058 3.937,0.058 ; 3.838,0.091 3.937,0.091 ; 3.838,0.124 3.937,0.124 ; 3.838,0.157 3.937,0.157 ; 3.838,0.191 3.937,0.191 ; 3.838,0.224 3.937,0.224 ; 3.838,0.257 3.937,0.257 ; 3.838,0.29 3.937,0.29 ; 3.838,0.323 3.937,0.323 ; 3.838,0.356 3.937,0.356 ; 3.838,0.389 3.937,0.389 ; 3.838,0.422 3.937,0.422 ; 3.838,0.455 3.937,0.455 ; 3.838,0.488 3.937,0.488 ; 3.838,0.521 3.937,0.521 ; 3.838,0.554 3.937,0.554 ; 3.838,0.587 3.937,0.587 ; 3.838,0.62 3.937,0.62 ; 3.838,0.653 3.937,0.653 ; 3.838,0.686 3.937,0.686 ; 3.838,0.719 3.937,0.719 ; 3.838,0.752 3.937,0.752 ; 3.838,0.785 3.937,0.785 ; 3.838,0.818 3.937,0.818 ; 3.838,0.851 3.937,0.851 ; 3.838,0.884 3.937,0.884 ; 3.838,0.917 3.937,0.917 ; 3.838,0.95 3.937,0.95 ; 3.838,0.983 3.937,0.983 ; 3.838,1.016 3.937,1.016 ; 3.838,1.049 3.937,1.049 ; 3.838,1.082 3.937,1.082 ; 3.838,1.115 3.937,1.115 ; 3.838,1.148 3.937,1.148 ; 3.838,1.181 3.937,1.181 ; 3.838,1.214 3.937,1.214 ; 3.838,1.247 3.937,1.247 ; 3.838,1.28 3.937,1.28 ; 3.838,1.313 3.937,1.313 ; 3.838,1.346 3.937,1.346 ; 3.838,1.379 3.937,1.379 ; 3.838,1.412 3.937,1.412 ; 3.838,1.445 3.937,1.445 ; 3.838,1.478 3.937,1.478 ; 3.838,1.511 3.937,1.511 ; 3.838,1.544 3.937,1.544 ; 3.838,1.577 3.937,1.577 ; 3.838,1.61 3.937,1.61 ; 3.838,1.643 3.937,1.643 ; 3.838,1.676 3.937,1.676 ; 3.838,1.709 3.937,1.709 ; 3.838,1.742 3.937,1.742 ; 3.838,1.775 3.937,1.775 ; 3.838,1.808 3.937,1.808 ; 3.838,1.841 3.937,1.841 ; 3.838,1.875 3.937,1.875 ; 3.838,1.908 3.937,1.908 ; 3.838,1.941 3.937,1.941 ; 3.838,1.974 3.937,1.974 ; 3.838,2.007 3.937,2.007 ; 3.838,2.04 3.937,2.04 ; 3.838,2.073 3.937,2.073 ; 3.838,2.106 3.937,2.106 ; 3.838,2.139 3.937,2.139 ; 3.838,2.172 3.937,2.172 ; 3.838,2.205 3.937,2.205 ; 3.838,2.238 3.937,2.238 ; 3.838,2.271 3.937,2.271 ; 3.838,2.304 3.937,2.304 ; 3.838,2.337 3.937,2.337 ; 3.838,2.37 3.937,2.37 ; 3.838,2.403 3.937,2.403 ; 3.838,2.436 3.937,2.436 ; 3.838,2.469 3.937,2.469 ; 3.838,2.502 3.937,2.502 ; 3.838,2.535 3.937,2.535 ; 3.838,2.568 3.937,2.568 ; 3.838,2.601 3.937,2.601 ; 3.838,2.634 3.937,2.634 ; 3.838,2.667 3.937,2.667 ; 3.838,2.7 3.937,2.7 ; 3.838,2.733 3.937,2.733 ; 3.838,2.766 3.937,2.766 ; 3.838,2.799 3.937,2.799 ; 3.838,2.832 3.937,2.832 ; 3.838,2.865 3.937,2.865 ; 3.838,2.898 3.937,2.898